# Altium footprint library Library 3D.PcbLib: 288 footprints (part 9 of 18)
Each footprint in its own frame and in the unit in brackets; x right, y up, seen from the top. Pads: shape width x height; smd on the part's side, far side on the other; paste and mask are expansions set on the pad; w line width, h text height; cw(c..) or ccw(c..) is an arc to the next point about the centre after c.
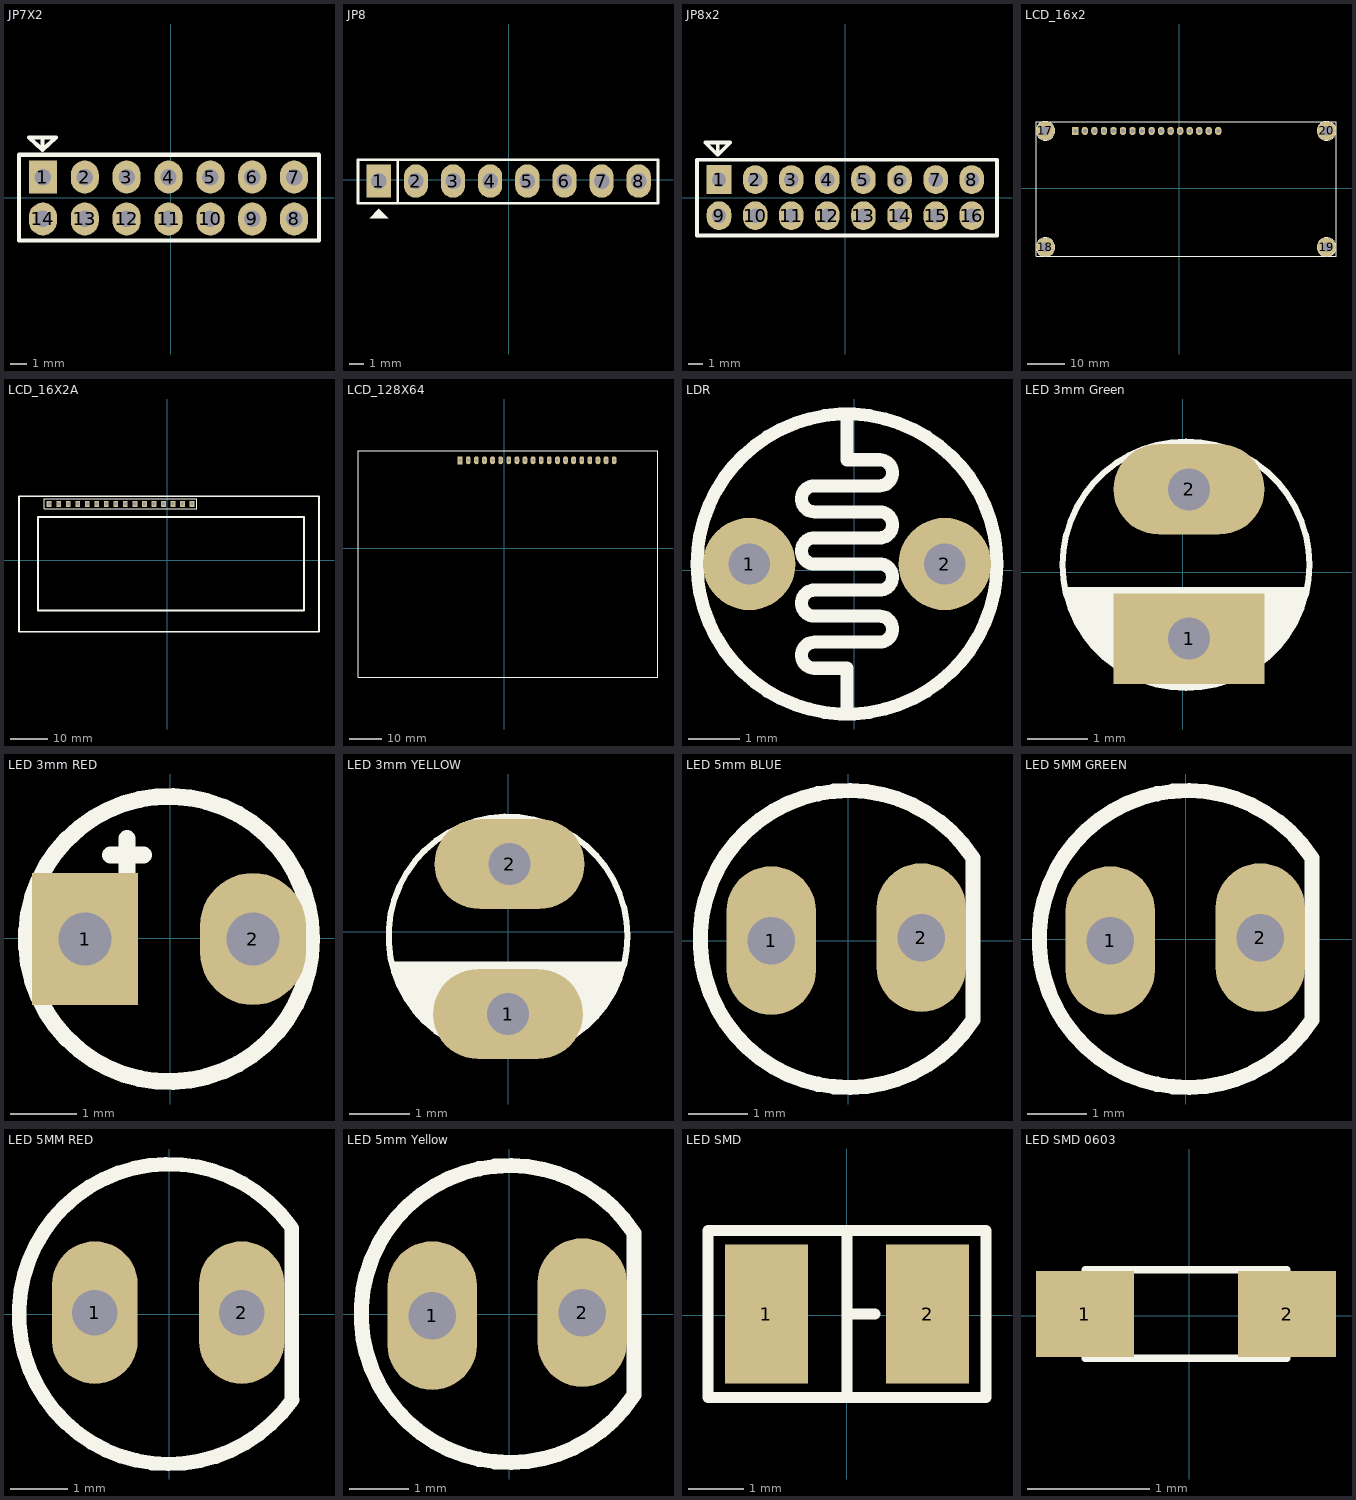
[diagram p8: the footprints below, top view; thin cyan lines are the x and y axes]

## JP7X2 [mm]
pads (14):
  rect 1.7x2 hole 1: 1(-7.75,1.25)
  oval 1.7x2 hole 1: 2(-5.21,1.25) 3(-2.67,1.25) 4(-0.13,1.25) 5(2.41,1.25) 6(4.95,1.25) 7(7.49,1.25) 8(7.49,-1.29) 9(4.95,-1.29) 10(2.41,-1.29) 11(-0.13,-1.29) 12(-2.67,-1.29) 13(-5.21,-1.29) 14(-7.75,-1.29)
Top Overlay:
  lines w0.254: -7.775,3.65 -7.775,2.9 ; -7.775,2.9 -6.95,3.65 -8.6,3.65 -7.775,2.9 ; -9.2,-2.6 -9.2,2.6 9,2.6 9,-2.6 -9.2,-2.6
3D body "JP7x2.STEP": height 8, standoff -3, extent -9.015,-2.425 8.765,2.375

## JP8 [mil]
pads (8):
  rect 65x90 hole 42: 1(-350.55,-3.39)
  oval 65x90 hole 42: 2(-250.55,-3.39) 3(-150.55,-3.39) 4(-50.55,-3.39) 5(49.45,-3.39) 6(149.45,-3.39) 7(249.45,-3.39) 8(349.45,-3.39)
Top Overlay:
  region: -350.55,-78.39 -375.55,-103.39 -325.55,-103.39
  lines w7: -299.55,-63.39 -299.55,52.61 ; -406.55,-63.39 -406.55,53.61 401.45,53.61 401.45,-63.39 -406.55,-63.39
3D body "JP1-8.stp": height 323.43, standoff -117.51, extent -398.58,-53.39 397.48,45.04

## JP8x2 [mm]
pads (16):
  rect 1.7x2 hole 1: 1(-8.75,1.25)
  oval 1.7x2 hole 1: 2(-6.25,1.25) 3(-3.75,1.25) 4(-1.25,1.25) 5(1.25,1.25) 6(3.75,1.25) 7(6.25,1.25) 8(8.75,1.25) 9(-8.75,-1.25) 10(-6.25,-1.25) 11(-3.75,-1.25) 12(-1.25,-1.25) 13(1.25,-1.25) 14(3.75,-1.25) 15(6.25,-1.25) 16(8.75,-1.25)
Top Overlay:
  lines w0.254: -8.837,3.825 -8.837,2.962 ; -8.837,2.962 -9.7,3.825 -7.975,3.825 -8.837,2.962 ; -10.275,-2.625 10.5,-2.625 10.5,2.625 -10.275,2.625 -10.275,-2.625
3D body "JP8x2.STEP": height 8, standoff -3, extent -10.05,-2.4 10.27,2.4

## LCD_16x2 [mm]
pads (20):
  rect 1.7x2.2 hole 1: 1(-27.75,15.25)
  oval 1.7x2.2 hole 1: 2(-25.21,15.25) 3(-22.67,15.25) 4(-20.13,15.25) 5(-17.59,15.25) 6(-15.05,15.25) 7(-12.51,15.25) 8(-9.97,15.25) 9(-7.43,15.25) 10(-4.89,15.25) 11(-2.35,15.25) 12(0.19,15.25) 13(2.73,15.25) 14(5.27,15.25) 15(7.81,15.25) 16(10.35,15.25)
  round 5 hole 2.5: 17(-35.75,15.25) 18(-35.75,-15.75) 19(39.25,-15.75) 20(39.25,15.25)
Top Overlay:
  circle w0.254: c-35.75,-15.75 r1.414
  circle w0.254: c-35.75,-15.75 r2.5
  circle w0.254: c-35.75,15.25 r1.414
  circle w0.254: c-35.75,15.25 r2.5
  circle w0.254: c39.25,-15.75 r1.414
  circle w0.254: c39.25,-15.75 r2.5
  circle w0.254: c39.25,15.25 r1.581
  circle w0.254: c39.25,15.25 r2.5
  lines w0.254: -38.25,-18.25 -38.25,17.75 41.75,17.75 41.75,-18.25 -38.25,-18.25
3D body "LCD_16X2.STEP": height 1.58, standoff -15.39, extent -38.25,-18.25 41.75,17.75

## LCD_16X2A [mm]
pads (20):
  rect 1.3x1.6 hole 0.9: 1(-31.558,15.082) 2(-29.018,15.082) 3(-26.478,15.082) 4(-23.938,15.082) 5(-21.398,15.082) 6(-18.858,15.082) 7(-16.318,15.082) 8(-13.778,15.082) 9(-11.238,15.082) 10(-8.698,15.082) 11(-6.158,15.082) 12(-3.618,15.082) 13(-1.078,15.082) 14(1.462,15.082) 15(4.002,15.082) 16(6.542,15.082)
  round 0 all layers, no hole paste+0 mask+0: ""(-37.756,15.234) ""(38.648,15.285)
  round 0 all layers, no hole: ""(-37.705,-17.201) ""(38.521,-17.151)
Top Overlay:
  lines w0.2: -32.828,13.812 7.812,13.812 7.812,16.352 -30.923,16.352 -32.828,16.352 -32.828,13.812
  lines w0.508: -39.61,17.089 40.451,17.089 40.451,-19.081 -39.584,-19.081 -39.584,16.962 ; -34.559,-13.446 -34.559,11.554 36.441,11.554 36.441,-13.446 -34.559,-13.446
3D body "C1602A - 16x2 characters LCD_with legs & strips.STEP": height 21.3, standoff -3, extent -39.558,-18.918 40.442,17.082

## LCD_128X64 [mm]
pads (20):
  rect 1.5x2.5 hole 0.8: 1(-13.75,27.5)
  oval 1.5x2.5 hole 0.8: 2(-11.21,27.5) 3(-8.67,27.5) 4(-6.13,27.5) 5(-3.59,27.5) 6(-1.05,27.5) 7(1.49,27.5) 8(4.03,27.5) 9(6.57,27.5) 10(9.11,27.5) 11(11.65,27.5) 12(14.19,27.5) 13(16.73,27.5) 14(19.27,27.5) 15(21.81,27.5) 16(24.35,27.5) 17(26.89,27.5) 18(29.43,27.5) 19(31.97,27.5) 20(34.51,27.5)
Top Overlay:
  lines w0.254: -45.75,-40.5 -45.75,30.5 48.25,30.5 48.25,-40.5 -45.75,-40.5
3D body "User Library-QC12864B.STEP": height 14.5, standoff -3, extent -45.225,-40 47.775,30

## LDR [mm]
pads (2):
  round 1.8 hole 0.8: 1(-2.045,0.121) 2(1.765,0.121)
Top Overlay:
  circle w0.254: c-0.14,0.121 r2.924
  lines w0.254: -0.14,-2.8 -0.14,-1.911 -0.775,-1.911 cw(c-0.775,-1.657) -0.775,-1.403 0.495,-1.403 ccw(c0.495,-1.149) 0.495,-0.895 -0.775,-0.895 cw(c-0.775,-0.641) -0.775,-0.387 0.495,-0.387 ccw(c0.495,-0.133) 0.495,0.121 -0.775,0.121 cw(c-0.775,0.375) -0.775,0.629 0.495,0.629 ccw(c0.495,0.883) 0.495,1.137 -0.775,1.137 cw(c-0.775,1.391) -0.775,1.645 0.495,1.645 ccw(c0.495,1.899) 0.495,2.153 -0.14,2.153 -0.14,3.042

## LED 3mm Green [mm]
pads (2):
  rect 2.5x1.5 hole 0.7: 1(0.1,-1.1)
  oval 2.5x1.5 hole 0.7: 2(0.1,1.375)
Top Overlay:
  circle w0.1: c0.05,0.125 r2.046
  region: -1.975,-0.25 2.05,-0.25 2.075,-0.275 1.85,-0.85 1.475,-1.325 1,-1.7 0.425,-1.925 0.05,-1.925 -0.65,-1.8 -1.25,-1.45 -1.725,-0.925
3D body "User Library-LED 3 MM_Green.STEP": height 5.2, standoff -3, extent -1.893,-1.4 2.093,2.084

## LED 3mm RED [mm]
pads (2):
  rect 1.6x2 hole 0.8: 1(-1.286,-0.014)
  oval 1.6x2 hole 0.8: 2(1.254,-0.014)
Top Overlay:
  circle w0.254: c-0.016,-0.014 r2.159
  lines w0.254: -0.905,1.256 -0.397,1.256 ; -0.651,1.002 -0.651,1.51
3D body "SW3DPS-REDLED-DIP.step": height 5.38, standoff -3.17, extent -2.008,-1.513 1.976,1.98

## LED 3mm YELLOW [mm]
pads (2):
  oval 2.5x1.5 hole 0.7: 1(0,-1.375) 2(0.025,1.125)
Top Overlay:
  circle w0.1: c0,-0.075 r1.99
  region: -1.95,-0.5 1.95,-0.5 1.7,-1.1 1.325,-1.575 1,-1.775 0.675,-1.9 0.325,-1.95 -0.375,-1.95 -0.725,-1.85 -1.05,-1.75 -1.325,-1.575 -1.75,-1.1
3D body "User Library-LED 3 MM_Yellow.STEP": height 5.2, standoff -3, extent -1.968,-1.625 2.018,1.859

## LED 5mm BLUE [mm]
pads (2):
  oval 1.5x2.5 hole 0.8: 1(-1.3,0) 2(1.225,0.05)
Top Overlay:
  lines w0.254: 2.095,-1.339 cw(c0.001,0.026) 2.095,1.39 2.095,-1.339
3D body "LED BLUE.STEP": height 8, standoff -15, extent -2.8,-2.795 2.522,2.85

## LED 5MM GREEN [mm]
pads (2):
  oval 1.5x2.5 hole 0.8: 1(-1.275,-0.025) 2(1.25,0.025)
Top Overlay:
  lines w0.254: 2.12,-1.364 cw(c0.026,0.001) 2.12,1.365 2.12,-1.364
3D body "LED GREEN.STEP": height 8, standoff -15, extent -2.8,-2.82 2.522,2.825

## LED 5MM RED [mm]
pads (2):
  oval 1.5x2.5 hole 0.8: 1(-1.3,0.025) 2(1.275,0.025)
Top Overlay:
  lines w0.254: 2.131,1.543 ccw(c0,0) 2.158,-1.505 ; 2.15,-1.5 2.15,1.5
3D body "LED RED.STEP": height 8, standoff -15, extent -2.797,-2.8 2.525,2.845

## LED 5mm Yellow [mm]
pads (2):
  oval 1.5x2.5 hole 0.8: 1(-1.3,-0.025) 2(1.225,0.025)
Top Overlay:
  lines w0.254: 2.095,-1.364 cw(c0.001,0.001) 2.095,1.365 2.095,-1.364
3D body "LED YELLOW.STEP": height 8, standoff -15, extent -2.798,-2.798 2.525,2.847

## LED SMD [mm]
pads (2):
  rect 1.5x2.5 smd: 1(-1.443,0.019) 2(1.457,0.019)
Top Overlay:
  lines w0.2: 0.007,-1.481 0.007,1.519 ; 0.007,0.019 0.507,0.019 ; -2.493,-1.481 2.507,-1.481 2.507,1.519 -2.493,1.519 -2.493,-1.481
3D body "Led Red Outdoor.STEP": height 2.6, standoff 0, extent -1.693,-1.481 1.707,1.519

## LED SMD 0603 [mm]
pads (2):
  rect 0.8x0.7 smd: 1(-0.85,0.013) 2(0.8,0.013)
Top Overlay:
  lines w0.06: -0.85,-0.35 -0.85,0.375 0.8,0.375 0.8,-0.35 -0.85,-0.35
3D body "SW3dPS-LED SMD0603.STEP": height 0.68, standoff 0, extent -0.85,-0.35 0.8,0.375